# Altium footprint library Connector.PcbLib: 536 footprints (part 18 of 34)
Each footprint in its own frame and in the unit in brackets; x right, y up, seen from the top. Pads: shape width x height; smd on the part's side, far side on the other; paste and mask are expansions set on the pad; w line width, h text height; cw(c..) or ccw(c..) is an arc to the next point about the centre after c.
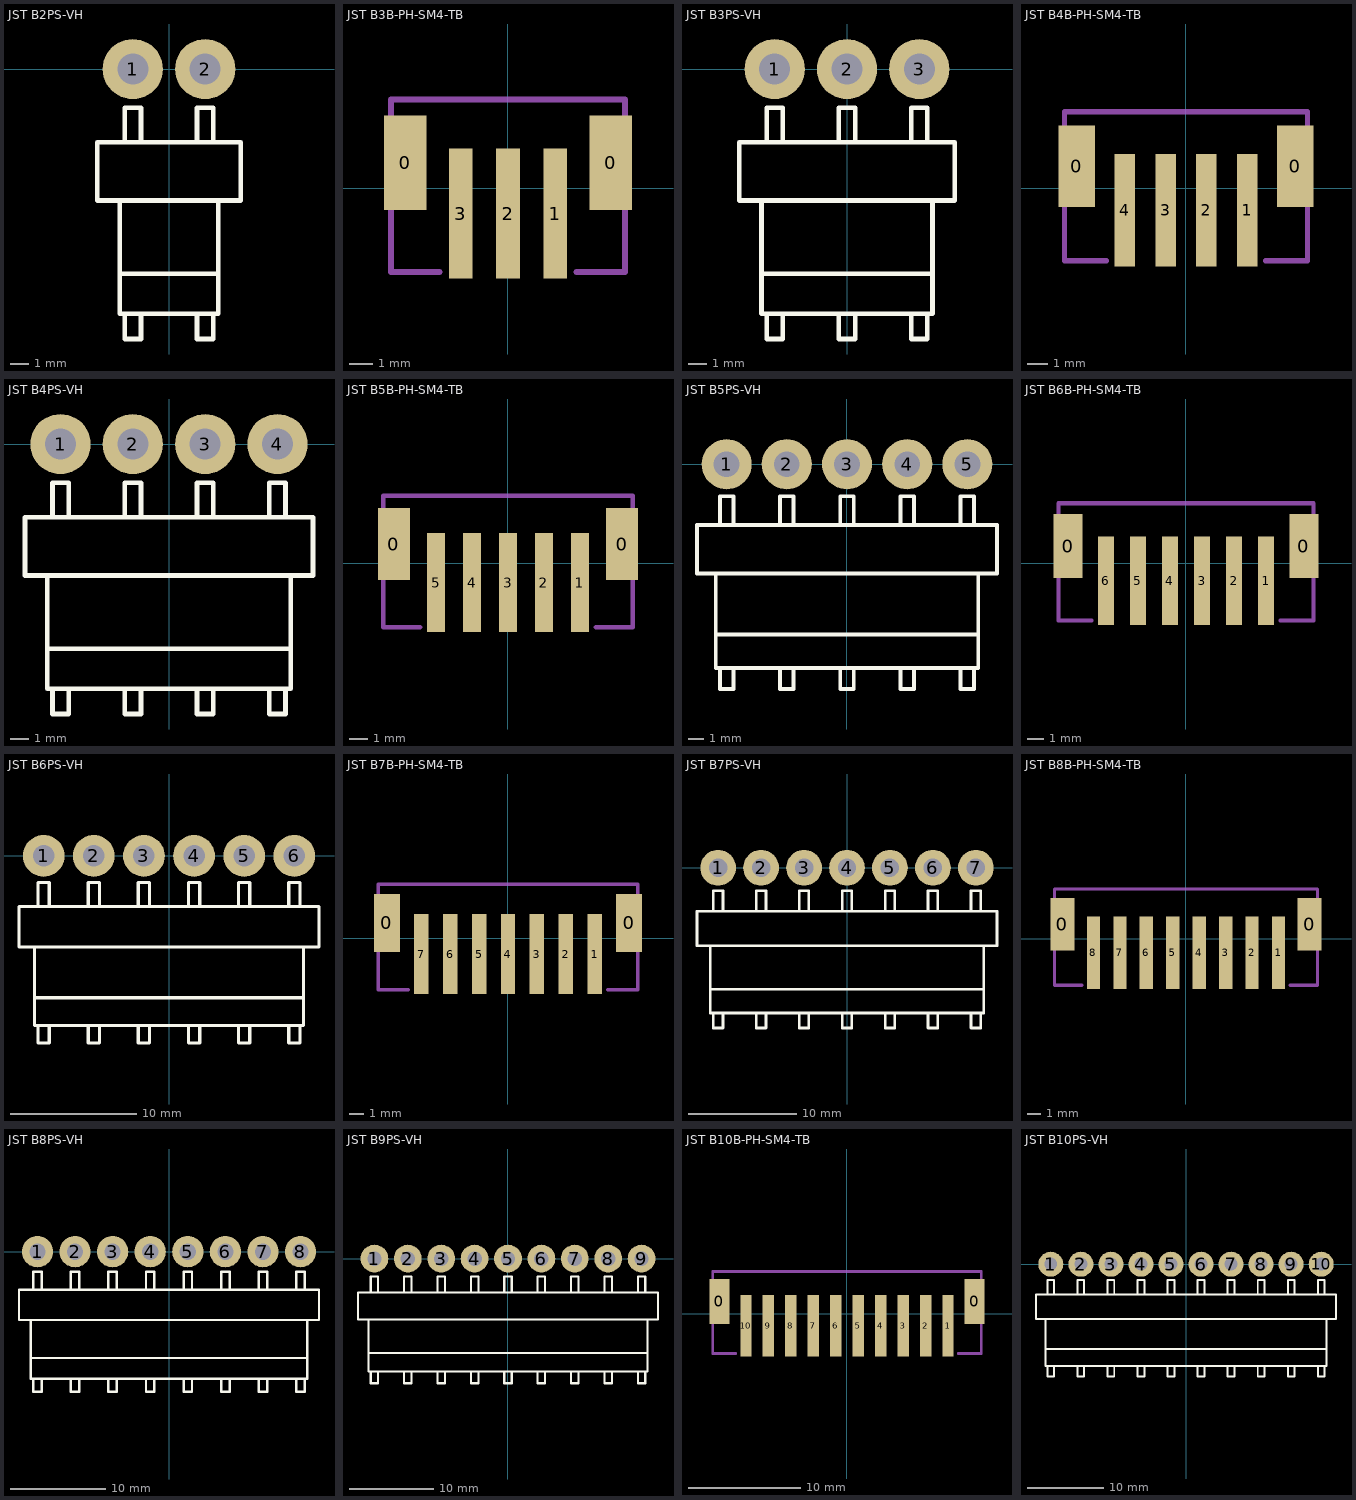
[diagram p17: the footprints below, top view; thin cyan lines are the x and y axes]

## JST B2PS-VH [mm]
pads (2):
  round 3.3 hole 1.7: 1(-1.98,0) 2(1.98,0)
Top Overlay:
  lines w0.254: -2.7,-11.201 2.7,-11.201 ; -2.7,-7.2 -2.7,-13.4 2.7,-13.4 2.7,-7.2 ; -2.423,-13.411 -2.423,-14.783 -1.537,-14.783 -1.537,-13.4 ; -2.423,-4 -2.423,-2.108 -1.537,-2.108 -1.537,-4 ; 1.537,-13.411 1.537,-14.783 2.423,-14.783 2.423,-13.4 ; 1.537,-4 1.537,-2.108 2.423,-2.108 2.423,-4 ; -3.93,-7.2 3.93,-7.2 3.93,-4 -3.93,-4 -3.93,-7.2
3D body "B2PS-VH.STEP": height 8.5, standoff -3.6, extent -3.93,-14.899 3.93,0.571

## JST B3B-PH-SM4-TB [mm]
pads (5):
  rect 1.8x4 smd: 0(-4.35,1.075) 0(4.35,1.075)
  rect 1x5.5 smd: 1(2,-1.075) 2(0,-1.075) 3(-2,-1.075)
Mechanical 15:
  lines w0.254: -2.9,-3.55 -4.95,-3.55 -4.95,3.75 4.95,3.75 4.95,-3.55 2.9,-3.55
3D body "B3B-PH-SM4-TB.STEP": height 6.6, standoff 0, extent -4.975,-3.45 4.975,3.55

## JST B3PS-VH [mm]
pads (3):
  round 3.3 hole 1.7: 1(-3.96,0) 2(0,0) 3(3.96,0)
Top Overlay:
  lines w0.254: -4.68,-11.201 4.68,-11.201 ; -4.68,-7.2 -4.68,-13.4 4.68,-13.4 4.68,-7.2 ; -4.403,-13.411 -4.403,-14.783 -3.517,-14.783 -3.517,-13.4 ; -4.403,-4 -4.403,-2.108 -3.517,-2.108 -3.517,-4 ; -0.443,-13.411 -0.443,-14.783 0.443,-14.783 0.443,-13.4 ; -0.443,-4 -0.443,-2.108 0.443,-2.108 0.443,-4 ; 3.517,-13.411 3.517,-14.783 4.403,-14.783 4.403,-13.4 ; 3.517,-4 3.517,-2.108 4.403,-2.108 4.403,-4 ; -5.91,-7.2 5.91,-7.2 5.91,-4 -5.91,-4 -5.91,-7.2
3D body "B3PS-VH.STEP": height 8.5, standoff -3.6, extent -5.91,-14.899 5.91,0.571

## JST B4B-PH-SM4-TB [mm]
pads (6):
  rect 1.8x4 smd: 0(-5.35,1.075) 0(5.35,1.075)
  rect 1x5.5 smd: 1(3,-1.075) 2(1,-1.075) 3(-1,-1.075) 4(-3,-1.075)
Mechanical 15:
  lines w0.254: -3.9,-3.55 -5.95,-3.55 -5.95,3.75 5.95,3.75 5.95,-3.55 3.9,-3.55
3D body "B4B-PH-SM4-TB.STEP": height 6.6, standoff 0, extent -5.975,-3.3 5.975,3.7

## JST B4PS-VH [mm]
pads (4):
  round 3.3 hole 1.7: 1(-5.94,0) 2(-1.98,0) 3(1.98,0) 4(5.94,0)
Top Overlay:
  lines w0.254: -6.66,-11.201 6.66,-11.201 ; -6.66,-7.2 -6.66,-13.4 6.66,-13.4 6.66,-7.2 ; -6.383,-13.411 -6.383,-14.783 -5.497,-14.783 -5.497,-13.4 ; -6.383,-4 -6.383,-2.108 -5.497,-2.108 -5.497,-4 ; -2.423,-13.411 -2.423,-14.783 -1.537,-14.783 -1.537,-13.4 ; -2.423,-4 -2.423,-2.108 -1.537,-2.108 -1.537,-4 ; 1.537,-13.411 1.537,-14.783 2.423,-14.783 2.423,-13.4 ; 1.537,-4 1.537,-2.108 2.423,-2.108 2.423,-4 ; 5.497,-13.411 5.497,-14.783 6.383,-14.783 6.383,-13.4 ; 5.497,-4 5.497,-2.108 6.383,-2.108 6.383,-4 ; -7.89,-7.2 -7.89,-4 7.89,-4 7.89,-7.2 -7.89,-7.2
3D body "B4PS-VH.STEP": height 8.5, standoff -3.6, extent -7.89,-14.899 7.89,0.571

## JST B5B-PH-SM4-TB [mm]
pads (7):
  rect 1.8x4 smd: 0(-6.35,1.075) 0(6.35,1.075)
  rect 1x5.5 smd: 1(4,-1.075) 2(2,-1.075) 3(0,-1.075) 4(-2,-1.075) 5(-4,-1.075)
Mechanical 15:
  lines w0.254: -4.9,-3.55 -6.95,-3.55 -6.95,3.75 6.95,3.75 6.95,-3.55 4.9,-3.55
3D body "B5B-PH-SM4-TB.STEP": height 6.6, standoff 0, extent -6.975,-3.3 6.975,3.7

## JST B5PS-VH [mm]
pads (5):
  round 3.3 hole 1.7: 1(-7.92,0) 2(-3.96,0) 3(0,0) 4(3.96,0) 5(7.92,0)
Top Overlay:
  lines w0.254: -8.64,-11.201 8.64,-11.201 ; -8.64,-7.2 -8.64,-13.4 8.64,-13.4 8.64,-7.2 ; -8.363,-13.411 -8.363,-14.783 -7.477,-14.783 -7.477,-13.4 ; -8.363,-4 -8.363,-2.108 -7.477,-2.108 -7.477,-4 ; -4.403,-13.411 -4.403,-14.783 -3.517,-14.783 -3.517,-13.4 ; -4.403,-4 -4.403,-2.108 -3.517,-2.108 -3.517,-4 ; -0.443,-13.411 -0.443,-14.783 0.443,-14.783 0.443,-13.4 ; -0.443,-4 -0.443,-2.108 0.443,-2.108 0.443,-4 ; 3.517,-13.411 3.517,-14.783 4.403,-14.783 4.403,-13.4 ; 3.517,-4 3.517,-2.108 4.403,-2.108 4.403,-4 ; 7.477,-13.411 7.477,-14.783 8.363,-14.783 8.363,-13.4 ; 7.477,-4 7.477,-2.108 8.363,-2.108 8.363,-4 ; -9.87,-7.2 9.87,-7.2 9.87,-4 -9.87,-4 -9.87,-7.2
3D body "B5PS-VH.STEP": height 8.5, standoff -3.6, extent -9.87,-14.899 9.87,0.571

## JST B6B-PH-SM4-TB [mm]
pads (8):
  rect 1.8x4 smd: 0(-7.35,1.075) 0(7.35,1.075)
  rect 1x5.5 smd: 1(5,-1.075) 2(3,-1.075) 3(1,-1.075) 4(-1,-1.075) 5(-3,-1.075) 6(-5,-1.075)
Mechanical 15:
  lines w0.254: -5.9,-3.55 -7.95,-3.55 -7.95,3.75 7.95,3.75 7.95,-3.55 5.9,-3.55
3D body "B6B-PH-SM4-TB.STEP": height 6.6, standoff 0, extent -7.975,-3.3 7.975,3.7

## JST B6PS-VH [mm]
pads (6):
  round 3.3 hole 1.7: 1(-9.9,0) 2(-5.94,0) 3(-1.98,0) 4(1.98,0) 5(5.94,0) 6(9.9,0)
Top Overlay:
  lines w0.254: -10.62,-11.201 10.62,-11.201 ; -10.62,-7.2 -10.62,-13.4 10.62,-13.4 10.62,-7.2 ; -10.343,-13.411 -10.343,-14.783 -9.457,-14.783 -9.457,-13.4 ; -10.343,-4 -10.343,-2.108 -9.457,-2.108 -9.457,-4 ; -6.383,-13.411 -6.383,-14.783 -5.497,-14.783 -5.497,-13.4 ; -6.383,-4 -6.383,-2.108 -5.497,-2.108 -5.497,-4 ; -2.423,-13.411 -2.423,-14.783 -1.537,-14.783 -1.537,-13.4 ; -2.423,-4 -2.423,-2.108 -1.537,-2.108 -1.537,-4 ; 1.537,-13.411 1.537,-14.783 2.423,-14.783 2.423,-13.4 ; 1.537,-4 1.537,-2.108 2.423,-2.108 2.423,-4 ; 5.497,-13.411 5.497,-14.783 6.383,-14.783 6.383,-13.4 ; 5.497,-4 5.497,-2.108 6.383,-2.108 6.383,-4 ; 9.457,-13.411 9.457,-14.783 10.343,-14.783 10.343,-13.4 ; 9.457,-4 9.457,-2.108 10.343,-2.108 10.343,-4 ; -11.85,-7.2 -11.85,-4 11.85,-4 11.85,-7.2 -11.85,-7.2
3D body "B6PS-VH.STEP": height 8.5, standoff -3.6, extent -11.85,-14.899 11.85,0.571

## JST B7B-PH-SM4-TB [mm]
pads (9):
  rect 1.8x4 smd: 0(-8.35,1.075) 0(8.35,1.075)
  rect 1x5.5 smd: 1(6,-1.075) 2(4,-1.075) 3(2,-1.075) 4(0,-1.075) 5(-2,-1.075) 6(-4,-1.075) 7(-6,-1.075)
Mechanical 15:
  lines w0.254: -6.9,-3.55 -8.95,-3.55 -8.95,3.75 8.95,3.75 8.95,-3.55 6.9,-3.55
3D body "B7B-PH-SM4-TB.STEP": height 6.6, standoff 0, extent -8.975,-3.3 8.975,3.7

## JST B7PS-VH [mm]
pads (7):
  round 3.3 hole 1.7: 1(-11.88,0) 2(-7.92,0) 3(-3.96,0) 4(0,0) 5(3.96,0) 6(7.92,0) 7(11.88,0)
Top Overlay:
  lines w0.254: -12.6,-11.201 12.6,-11.201 ; -12.6,-7.2 -12.6,-13.4 12.6,-13.4 12.6,-7.2 ; -12.323,-13.411 -12.323,-14.783 -11.437,-14.783 -11.437,-13.4 ; -12.323,-4 -12.323,-2.108 -11.437,-2.108 -11.437,-4 ; -8.363,-13.411 -8.363,-14.783 -7.477,-14.783 -7.477,-13.4 ; -8.363,-4 -8.363,-2.108 -7.477,-2.108 -7.477,-4 ; -4.403,-13.411 -4.403,-14.783 -3.517,-14.783 -3.517,-13.4 ; -4.403,-4 -4.403,-2.108 -3.517,-2.108 -3.517,-4 ; -0.443,-13.411 -0.443,-14.783 0.443,-14.783 0.443,-13.4 ; -0.443,-4 -0.443,-2.108 0.443,-2.108 0.443,-4 ; 3.517,-13.411 3.517,-14.783 4.403,-14.783 4.403,-13.4 ; 3.517,-4 3.517,-2.108 4.403,-2.108 4.403,-4 ; 7.477,-13.411 7.477,-14.783 8.363,-14.783 8.363,-13.4 ; 7.477,-4 7.477,-2.108 8.363,-2.108 8.363,-4 ; 11.437,-13.411 11.437,-14.783 12.323,-14.783 12.323,-13.4 ; 11.437,-4 11.437,-2.108 12.323,-2.108 12.323,-4 ; -13.83,-7.2 -13.83,-4 13.83,-4 13.83,-7.2 -13.83,-7.2
3D body "B7PS-VH.STEP": height 8.5, standoff -3.6, extent -13.83,-14.899 13.83,0.571

## JST B8B-PH-SM4-TB [mm]
pads (10):
  rect 1.8x4 smd: 0(-9.35,1.075) 0(9.35,1.075)
  rect 1x5.5 smd: 1(7,-1.075) 2(5,-1.075) 3(3,-1.075) 4(1,-1.075) 5(-1,-1.075) 6(-3,-1.075) 7(-5,-1.075) 8(-7,-1.075)
Mechanical 15:
  lines w0.254: -7.9,-3.55 -9.95,-3.55 -9.95,3.75 9.95,3.75 9.95,-3.55 7.9,-3.55
3D body "B8B-PH-SM4-TB.STEP": height 6.6, standoff 0, extent -9.975,-3.4 9.975,3.6

## JST B8PS-VH [mm]
pads (8):
  round 3.3 hole 1.7: 1(-13.86,0) 2(-9.9,0) 3(-5.94,0) 4(-1.98,0) 5(1.98,0) 6(5.94,0) 7(9.9,0) 8(13.86,0)
Top Overlay:
  lines w0.254: -14.58,-11.201 -10.62,-11.201 14.58,-11.201 ; -14.58,-7.2 -14.58,-13.4 -10.62,-13.4 14.58,-13.4 14.58,-7.2 ; -14.303,-13.411 -14.303,-14.783 -13.417,-14.783 -13.417,-13.4 ; -14.303,-4 -14.303,-2.108 -13.417,-2.108 -13.417,-4 ; -10.343,-13.411 -10.343,-14.783 -9.457,-14.783 -9.457,-13.4 ; -10.343,-4 -10.343,-2.108 -9.457,-2.108 -9.457,-4 ; -6.383,-13.411 -6.383,-14.783 -5.497,-14.783 -5.497,-13.4 ; -6.383,-4 -6.383,-2.108 -5.497,-2.108 -5.497,-4 ; -2.423,-13.411 -2.423,-14.783 -1.537,-14.783 -1.537,-13.4 ; -2.423,-4 -2.423,-2.108 -1.537,-2.108 -1.537,-4 ; 1.537,-13.411 1.537,-14.783 2.423,-14.783 2.423,-13.4 ; 1.537,-4 1.537,-2.108 2.423,-2.108 2.423,-4 ; 5.497,-13.411 5.497,-14.783 6.383,-14.783 6.383,-13.4 ; 5.497,-4 5.497,-2.108 6.383,-2.108 6.383,-4 ; 9.457,-13.411 9.457,-14.783 10.343,-14.783 10.343,-13.4 ; 9.457,-4 9.457,-2.108 10.343,-2.108 10.343,-4 ; 13.417,-13.411 13.417,-14.783 14.303,-14.783 14.303,-13.4 ; 13.417,-4 13.417,-2.108 14.303,-2.108 14.303,-4 ; -15.81,-7.2 -15.81,-4 15.81,-4 15.81,-7.2 -11.85,-7.2 -15.81,-7.2
3D body "B8PS-VH.STEP": height 8.5, standoff -3.6, extent -15.81,-14.899 15.81,0.571

## JST B9PS-VH [mm]
pads (9):
  round 3.3 hole 1.7: 1(-15.84,0) 2(-11.88,0) 3(-7.92,0) 4(-3.96,0) 5(0,0) 6(3.96,0) 7(7.92,0) 8(11.88,0) 9(15.84,0)
Top Overlay:
  lines w0.254: -16.56,-11.201 -12.6,-11.201 -8.64,-11.201 16.56,-11.201 ; -16.56,-7.2 -16.56,-13.4 -12.6,-13.4 -8.64,-13.4 16.56,-13.4 16.56,-7.2 ; -16.283,-13.411 -16.283,-14.783 -15.397,-14.783 -15.397,-13.4 ; -16.283,-4 -16.283,-2.108 -15.397,-2.108 -15.397,-4 ; -12.323,-13.411 -12.323,-14.783 -11.437,-14.783 -11.437,-13.4 ; -12.323,-4 -12.323,-2.108 -11.437,-2.108 -11.437,-4 ; -8.363,-13.411 -8.363,-14.783 -7.477,-14.783 -7.477,-13.4 ; -8.363,-4 -8.363,-2.108 -7.477,-2.108 -7.477,-4 ; -4.403,-13.411 -4.403,-14.783 -3.517,-14.783 -3.517,-13.4 ; -4.403,-4 -4.403,-2.108 -3.517,-2.108 -3.517,-4 ; -0.443,-13.411 -0.443,-14.783 0.443,-14.783 0.443,-13.4 ; -0.443,-4 -0.443,-2.108 0.443,-2.108 0.443,-4 ; 3.517,-13.411 3.517,-14.783 4.403,-14.783 4.403,-13.4 ; 3.517,-4 3.517,-2.108 4.403,-2.108 4.403,-4 ; 7.477,-13.411 7.477,-14.783 8.363,-14.783 8.363,-13.4 ; 7.477,-4 7.477,-2.108 8.363,-2.108 8.363,-4 ; 11.437,-13.411 11.437,-14.783 12.323,-14.783 12.323,-13.4 ; 11.437,-4 11.437,-2.108 12.323,-2.108 12.323,-4 ; 15.397,-13.411 15.397,-14.783 16.283,-14.783 16.283,-13.4 ; 15.397,-4 15.397,-2.108 16.283,-2.108 16.283,-4 ; -17.79,-7.2 -13.83,-7.2 -9.87,-7.2 17.79,-7.2 17.79,-4 -17.79,-4 -17.79,-7.2
3D body "B9PS-VH.STEP": height 8.5, standoff -3.6, extent -17.79,-14.899 17.79,0.571

## JST B10B-PH-SM4-TB [mm]
pads (12):
  rect 1.8x4 smd: 0(-11.35,1.075) 0(11.35,1.075)
  rect 1x5.5 smd: 1(9,-1.075) 2(7,-1.075) 3(5,-1.075) 4(3,-1.075) 5(1,-1.075) 6(-1,-1.075) 7(-3,-1.075) 8(-5,-1.075) 9(-7,-1.075) 10(-9,-1.075)
Mechanical 15:
  lines w0.254: -9.9,-3.55 -11.95,-3.55 -11.95,3.75 11.95,3.75 11.95,-3.55 9.9,-3.55
3D body "B10B-PH-SM4-TB.STEP": height 6.6, standoff 0, extent -11.975,-3.4 11.975,3.6

## JST B10PS-VH [mm]
pads (10):
  round 3.3 hole 1.7: 1(-17.82,0) 2(-13.86,0) 3(-9.9,0) 4(-5.94,0) 5(-1.98,0) 6(1.98,0) 7(5.94,0) 8(9.9,0) 9(13.86,0) 10(17.82,0)
Top Overlay:
  lines w0.254: -18.54,-11.201 -14.58,-11.201 -10.62,-11.201 -6.66,-11.201 18.54,-11.201 ; -18.54,-7.2 -18.54,-13.4 -14.58,-13.4 -10.62,-13.4 -6.66,-13.4 18.54,-13.4 18.54,-7.2 ; -18.263,-13.411 -18.263,-14.783 -17.377,-14.783 -17.377,-13.4 ; -18.263,-4 -18.263,-2.108 -17.377,-2.108 -17.377,-4 ; -14.303,-13.411 -14.303,-14.783 -13.417,-14.783 -13.417,-13.4 ; -14.303,-4 -14.303,-2.108 -13.417,-2.108 -13.417,-4 ; -10.343,-13.411 -10.343,-14.783 -9.457,-14.783 -9.457,-13.4 ; -10.343,-4 -10.343,-2.108 -9.457,-2.108 -9.457,-4 ; -6.383,-13.411 -6.383,-14.783 -5.497,-14.783 -5.497,-13.4 ; -6.383,-4 -6.383,-2.108 -5.497,-2.108 -5.497,-4 ; -2.423,-13.411 -2.423,-14.783 -1.537,-14.783 -1.537,-13.4 ; -2.423,-4 -2.423,-2.108 -1.537,-2.108 -1.537,-4 ; 1.537,-13.411 1.537,-14.783 2.423,-14.783 2.423,-13.4 ; 1.537,-4 1.537,-2.108 2.423,-2.108 2.423,-4 ; 5.497,-13.411 5.497,-14.783 6.383,-14.783 6.383,-13.4 ; 5.497,-4 5.497,-2.108 6.383,-2.108 6.383,-4 ; 9.457,-13.411 9.457,-14.783 10.343,-14.783 10.343,-13.4 ; 9.457,-4 9.457,-2.108 10.343,-2.108 10.343,-4 ; 13.417,-13.411 13.417,-14.783 14.303,-14.783 14.303,-13.4 ; 13.417,-4 13.417,-2.108 14.303,-2.108 14.303,-4 ; 17.377,-13.411 17.377,-14.783 18.263,-14.783 18.263,-13.4 ; 17.377,-4 17.377,-2.108 18.263,-2.108 18.263,-4 ; -19.77,-7.2 -19.77,-4 19.77,-4 19.77,-7.2 -7.89,-7.2 -11.85,-7.2 -15.81,-7.2 -19.77,-7.2
3D body "B10PS-VH.STEP": height 8.5, standoff -3.6, extent -19.77,-14.899 19.77,0.571